# Altium footprint library ref-packages-longpad.PCBLIB: 1527 footprints (part 98 of 103) (continued)
## TSOP28 [mm]
pads (28):
  rect 0.3x1 smd: 1(-3.75,-9.7) 2(-3.25,-9.7) 3(-2.75,-9.7) 4(-2.25,-9.7) 5(-1.75,-9.7) 6(-1.25,-9.7) 7(-0.75,-9.7) 8(0.75,-9.7) 9(1.25,-9.7) 10(1.75,-9.7) 11(2.25,-9.7) 12(2.75,-9.7) 13(3.25,-9.7) 14(3.75,-9.7) 15(3.75,9.7) 16(3.25,9.7) 17(2.75,9.7) 18(2.25,9.7) 19(1.75,9.7) 20(1.25,9.7) 21(0.75,9.7) 22(-0.75,9.7) 23(-1.25,9.7) 24(-1.75,9.7) 25(-2.25,9.7) 26(-2.75,9.7) 27(-3.25,9.7) 28(-3.75,9.7)
Top Overlay:
  lines w0.254: -4,-8.8 -4,8.8 4,8.8 4,-8.8 -4,-8.8
  text "1" at -2.75,-7.4 h1.57
Mechanical 16:
  rectangle: -3.89,-10 -3.61,-8.88
  rectangle: -3.39,-10 -3.11,-8.88
  rectangle: -2.89,-10 -2.61,-8.88
  rectangle: -2.39,-10 -2.11,-8.88
  rectangle: -1.89,-10 -1.61,-8.88
  rectangle: -1.39,-10 -1.11,-8.88
  rectangle: -0.89,-10 -0.61,-8.88
  rectangle: 0.61,-10 0.89,-8.88
  rectangle: 1.11,-10 1.39,-8.88
  rectangle: 1.61,-10 1.89,-8.88
  rectangle: 2.11,-10 2.39,-8.88
  rectangle: 2.61,-10 2.89,-8.88
  rectangle: 3.11,-10 3.39,-8.88
  rectangle: 3.61,-10 3.89,-8.88
  rectangle: 3.61,8.88 3.89,10
  rectangle: 3.11,8.88 3.39,10
  rectangle: 2.61,8.88 2.89,10
  rectangle: 2.11,8.88 2.39,10
  rectangle: 1.61,8.88 1.89,10
  rectangle: 1.11,8.88 1.39,10
  rectangle: 0.61,8.88 0.89,10
  rectangle: -0.89,8.88 -0.61,10
  rectangle: -1.39,8.88 -1.11,10
  rectangle: -1.89,8.88 -1.61,10
  rectangle: -2.39,8.88 -2.11,10
  rectangle: -2.89,8.88 -2.61,10
  rectangle: -3.39,8.88 -3.11,10
  rectangle: -3.89,8.88 -3.61,10

## TSOP32 [mil]
pads (32):
  rect 47.24x14.17 smd: 1(-387.8,147.64) 2(-387.8,127.95) 3(-387.8,108.27) 4(-387.8,88.58) 5(-387.8,68.9) 6(-387.8,49.21) 7(-387.8,29.53) 8(-387.8,9.84) 9(-387.8,-9.84) 10(-387.8,-29.53) 11(-387.8,-49.21) 12(-387.8,-68.9) 13(-387.8,-88.58) 14(-387.8,-108.27) 15(-387.8,-127.95) 16(-387.8,-147.64) 17(387.8,-147.64) 18(387.8,-127.95) 19(387.8,-108.27) 20(387.8,-88.58) 21(387.8,-68.9) 22(387.8,-49.21) 23(387.8,-29.53) 24(387.8,-9.84) 25(387.8,9.84) 26(387.8,29.53) 27(387.8,49.21) 28(387.8,68.9) 29(387.8,88.58) 30(387.8,108.27) 31(387.8,127.95) 32(387.8,147.64)
Top Overlay:
  circle w10: c-323.23,118.11 r15.75
  lines w10: -354.33,-153.54 354.33,-153.54 354.33,153.54 -354.33,153.54 -354.33,-153.54
Mechanical 16:
  rectangle: -398.02,141.64 -356.02,153.64
  rectangle: -398.02,121.95 -356.02,133.95
  rectangle: -398.02,102.27 -356.02,114.27
  rectangle: -398.02,82.58 -356.02,94.58
  rectangle: -398.02,62.9 -356.02,74.9
  rectangle: -398.02,43.21 -356.02,55.21
  rectangle: -398.02,23.53 -356.02,35.53
  rectangle: -398.02,3.84 -356.02,15.84
  rectangle: -398.02,-15.84 -356.02,-3.84
  rectangle: -398.02,-35.53 -356.02,-23.53
  rectangle: -398.02,-55.21 -356.02,-43.21
  rectangle: -398.02,-74.9 -356.02,-62.9
  rectangle: -398.02,-94.58 -356.02,-82.58
  rectangle: -398.02,-114.27 -356.02,-102.27
  rectangle: -398.02,-133.95 -356.02,-121.95
  rectangle: -398.02,-153.64 -356.02,-141.64
  rectangle: 356.02,-153.64 398.02,-141.64
  rectangle: 356.02,-133.95 398.02,-121.95
  rectangle: 356.02,-114.27 398.02,-102.27
  rectangle: 356.02,-94.58 398.02,-82.58
  rectangle: 356.02,-74.9 398.02,-62.9
  rectangle: 356.02,-55.21 398.02,-43.21
  rectangle: 356.02,-35.53 398.02,-23.53
  rectangle: 356.02,-15.84 398.02,-3.84
  rectangle: 356.02,3.84 398.02,15.84
  rectangle: 356.02,23.53 398.02,35.53
  rectangle: 356.02,43.21 398.02,55.21
  rectangle: 356.02,62.9 398.02,74.9
  rectangle: 356.02,82.58 398.02,94.58
  rectangle: 356.02,102.27 398.02,114.27
  rectangle: 356.02,121.95 398.02,133.95
  rectangle: 356.02,141.64 398.02,153.64

## TSOP32L [mil]
pads (32):
  rect 62.99x11.81 smd: 1(-377.95,147.64) 2(-377.95,127.95) 3(-377.95,108.27) 4(-377.95,88.58) 5(-377.95,68.9) 6(-377.95,49.21) 7(-377.95,29.53) 8(-377.95,9.84) 9(-377.95,-9.84) 10(-377.95,-29.53) 11(-377.95,-49.21) 12(-377.95,-68.9) 13(-377.95,-88.58) 14(-377.95,-108.27) 15(-377.95,-127.95) 16(-377.95,-147.64) 17(377.95,-147.64) 18(377.95,-127.95) 19(377.95,-108.27) 20(377.95,-88.58) 21(377.95,-68.9) 22(377.95,-49.21) 23(377.95,-29.53) 24(377.95,-9.84) 25(377.95,9.84) 26(377.95,29.53) 27(377.95,49.21) 28(377.95,68.9) 29(377.95,88.58) 30(377.95,108.27) 31(377.95,127.95) 32(377.95,147.64)
Top Overlay:
  circle w8: c-295.28,108.27 r19.69
Mechanical 16:
  rectangle: -401.57,142.72 -357.28,152.56
  rectangle: -401.57,123.03 -357.28,132.87
  rectangle: -401.57,103.35 -357.28,113.19
  rectangle: -401.57,83.66 -357.28,93.5
  rectangle: -401.57,63.98 -357.28,73.82
  rectangle: -401.57,44.29 -357.28,54.13
  rectangle: -401.57,24.61 -357.28,34.45
  rectangle: -401.57,4.92 -357.28,14.76
  rectangle: -401.57,-14.76 -357.28,-4.92
  rectangle: -401.57,-34.45 -357.28,-24.61
  rectangle: -401.57,-54.13 -357.28,-44.29
  rectangle: -401.57,-73.82 -357.28,-63.98
  rectangle: -401.57,-93.5 -357.28,-83.66
  rectangle: -401.57,-113.19 -357.28,-103.35
  rectangle: -401.57,-132.87 -357.28,-123.03
  rectangle: -401.57,-152.56 -357.28,-142.72
  rectangle: 357.28,-152.56 401.57,-142.72
  rectangle: 357.28,-132.87 401.57,-123.03
  rectangle: 357.28,-113.19 401.57,-103.35
  rectangle: 357.28,-93.5 401.57,-83.66
  rectangle: 357.28,-73.82 401.57,-63.98
  rectangle: 357.28,-54.13 401.57,-44.29
  rectangle: 357.28,-34.45 401.57,-24.61
  rectangle: 357.28,-14.76 401.57,-4.92
  rectangle: 357.28,4.92 401.57,14.76
  rectangle: 357.28,24.61 401.57,34.45
  rectangle: 357.28,44.29 401.57,54.13
  rectangle: 357.28,63.98 401.57,73.82
  rectangle: 357.28,83.66 401.57,93.5
  rectangle: 357.28,103.35 401.57,113.19
  rectangle: 357.28,123.03 401.57,132.87
  rectangle: 357.28,142.72 401.57,152.56
  lines w8: -354.33,-153.54 354.33,-153.54 354.33,153.54 -354.33,153.54 -354.33,-153.54

## TSOP40 [mil]
pads (40):
  rect 11.81x62.99 smd: 1(-187.01,-377.95) 2(-167.32,-377.95) 3(-147.64,-377.95) 4(-127.95,-377.95) 5(-108.27,-377.95) 6(-88.58,-377.95) 7(-68.9,-377.95) 8(-49.21,-377.95) 9(-29.53,-377.95) 10(-9.84,-377.95) 11(9.84,-377.95) 12(29.53,-377.95) 13(49.21,-377.95) 14(68.9,-377.95) 15(88.58,-377.95) 16(108.27,-377.95) 17(127.95,-377.95) 18(147.64,-377.95) 19(167.32,-377.95) 20(187.01,-377.95) 21(187.01,377.95) 22(167.32,377.95) 23(147.64,377.95) 24(127.95,377.95) 25(108.27,377.95) 26(88.58,377.95) 27(68.9,377.95) 28(49.21,377.95) 29(29.53,377.95) 30(9.84,377.95) 31(-9.84,377.95) 32(-29.53,377.95) 33(-49.21,377.95) 34(-68.9,377.95) 35(-88.58,377.95) 36(-108.27,377.95) 37(-127.95,377.95) 38(-147.64,377.95) 39(-167.32,377.95) 40(-187.01,377.95)
Top Overlay:
  circle w10: c-173.23,-311.02 r11.81
  text "40" at -186.27,296.06 h49.6
Mechanical 16:
  rectangle: -192.91,-397.64 -181.1,-364.17
  rectangle: -173.23,-397.64 -161.42,-364.17
  rectangle: -153.54,-397.64 -141.73,-364.17
  rectangle: -133.86,-397.64 -122.05,-364.17
  rectangle: -114.17,-397.64 -102.36,-364.17
  rectangle: -94.49,-397.64 -82.68,-364.17
  rectangle: -74.8,-397.64 -62.99,-364.17
  rectangle: -55.12,-397.64 -43.31,-364.17
  rectangle: -35.43,-397.64 -23.62,-364.17
  rectangle: -15.75,-397.64 -3.94,-364.17
  rectangle: 3.94,-397.64 15.75,-364.17
  rectangle: 23.62,-397.64 35.43,-364.17
  rectangle: 43.31,-397.64 55.12,-364.17
  rectangle: 62.99,-397.64 74.8,-364.17
  rectangle: 82.68,-397.64 94.49,-364.17
  rectangle: 102.36,-397.64 114.17,-364.17
  rectangle: 122.05,-397.64 133.86,-364.17
  rectangle: 141.73,-397.64 153.54,-364.17
  rectangle: 161.42,-397.64 173.23,-364.17
  rectangle: 181.1,-397.64 192.91,-364.17
  rectangle: 181.1,364.17 192.91,397.64
  rectangle: 161.42,364.17 173.23,397.64
  rectangle: 141.73,364.17 153.54,397.64
  rectangle: 122.05,364.17 133.86,397.64
  rectangle: 102.36,364.17 114.17,397.64
  rectangle: 82.68,364.17 94.49,397.64
  rectangle: 62.99,364.17 74.8,397.64
  rectangle: 43.31,364.17 55.12,397.64
  rectangle: 23.62,364.17 35.43,397.64
  rectangle: 3.94,364.17 15.75,397.64
  rectangle: -15.75,364.17 -3.94,397.64
  rectangle: -35.43,364.17 -23.62,397.64
  rectangle: -55.12,364.17 -43.31,397.64
  rectangle: -74.8,364.17 -62.99,397.64
  rectangle: -94.49,364.17 -82.68,397.64
  rectangle: -114.17,364.17 -102.36,397.64
  rectangle: -133.86,364.17 -122.05,397.64
  rectangle: -153.54,364.17 -141.73,397.64
  rectangle: -173.23,364.17 -161.42,397.64
  rectangle: -192.91,364.17 -181.1,397.64
  lines w8: -196.65,-362.01 196.65,-362.01 196.65,362.01 -196.65,362.01 -196.65,-362.01

## TSOP40L [mil]
pads (40):
  rect 62.99x11.81 smd: 1(-377.95,187.01) 2(-377.95,167.32) 3(-377.95,147.64) 4(-377.95,127.95) 5(-377.95,108.27) 6(-377.95,88.58) 7(-377.95,68.9) 8(-377.95,49.21) 9(-377.95,29.53) 10(-377.95,9.84) 11(-377.95,-9.84) 12(-377.95,-29.53) 13(-377.95,-49.21) 14(-377.95,-68.9) 15(-377.95,-88.58) 16(-377.95,-108.27) 17(-377.95,-127.95) 18(-377.95,-147.64) 19(-377.95,-167.32) 20(-377.95,-187.01) 21(377.95,-187.01) 22(377.95,-167.32) 23(377.95,-147.64) 24(377.95,-127.95) 25(377.95,-108.27) 26(377.95,-88.58) 27(377.95,-68.9) 28(377.95,-49.21) 29(377.95,-29.53) 30(377.95,-9.84) 31(377.95,9.84) 32(377.95,29.53) 33(377.95,49.21) 34(377.95,68.9) 35(377.95,88.58) 36(377.95,108.27) 37(377.95,127.95) 38(377.95,147.64) 39(377.95,167.32) 40(377.95,187.01)
Top Overlay:
  circle w8: c-305.12,147.64 r19.69
Mechanical 16:
  rectangle: -401.57,182.09 -357.28,191.93
  rectangle: -401.57,162.4 -357.28,172.24
  rectangle: -401.57,142.72 -357.28,152.56
  rectangle: -401.57,123.03 -357.28,132.87
  rectangle: -401.57,103.35 -357.28,113.19
  rectangle: -401.57,83.66 -357.28,93.5
  rectangle: -401.57,63.98 -357.28,73.82
  rectangle: -401.57,44.29 -357.28,54.13
  rectangle: -401.57,24.61 -357.28,34.45
  rectangle: -401.57,4.92 -357.28,14.76
  rectangle: -401.57,-14.76 -357.28,-4.92
  rectangle: -401.57,-34.45 -357.28,-24.61
  rectangle: -401.57,-54.13 -357.28,-44.29
  rectangle: -401.57,-73.82 -357.28,-63.98
  rectangle: -401.57,-93.5 -357.28,-83.66
  rectangle: -401.57,-113.19 -357.28,-103.35
  rectangle: -401.57,-132.87 -357.28,-123.03
  rectangle: -401.57,-152.56 -357.28,-142.72
  rectangle: -401.57,-172.24 -357.28,-162.4
  rectangle: -401.57,-191.93 -357.28,-182.09
  rectangle: 357.28,-191.93 401.57,-182.09
  rectangle: 357.28,-172.24 401.57,-162.4
  rectangle: 357.28,-152.56 401.57,-142.72
  rectangle: 357.28,-132.87 401.57,-123.03
  rectangle: 357.28,-113.19 401.57,-103.35
  rectangle: 357.28,-93.5 401.57,-83.66
  rectangle: 357.28,-73.82 401.57,-63.98
  rectangle: 357.28,-54.13 401.57,-44.29
  rectangle: 357.28,-34.45 401.57,-24.61
  rectangle: 357.28,-14.76 401.57,-4.92
  rectangle: 357.28,4.92 401.57,14.76
  rectangle: 357.28,24.61 401.57,34.45
  rectangle: 357.28,44.29 401.57,54.13
  rectangle: 357.28,63.98 401.57,73.82
  rectangle: 357.28,83.66 401.57,93.5
  rectangle: 357.28,103.35 401.57,113.19
  rectangle: 357.28,123.03 401.57,132.87
  rectangle: 357.28,142.72 401.57,152.56
  rectangle: 357.28,162.4 401.57,172.24
  rectangle: 357.28,182.09 401.57,191.93
  lines w8: -354.33,-192.91 354.33,-192.91 354.33,192.91 -354.33,192.91 -354.33,-192.91

## TSOP48 [mil]
pads (48):
  rect 11.81x62.99 smd: 1(-226.38,-377.95) 2(-206.69,-377.95) 3(-187.01,-377.95) 4(-167.32,-377.95) 5(-147.64,-377.95) 6(-127.95,-377.95) 7(-108.27,-377.95) 8(-88.58,-377.95) 9(-68.9,-377.95) 10(-49.21,-377.95) 11(-29.53,-377.95) 12(-9.84,-377.95) 13(9.84,-377.95) 14(29.53,-377.95) 15(49.21,-377.95) 16(68.9,-377.95) 17(88.58,-377.95) 18(108.27,-377.95) 19(127.95,-377.95) 20(147.64,-377.95) 21(167.32,-377.95) 22(187.01,-377.95) 23(206.69,-377.95) 24(226.38,-377.95) 25(226.38,377.95) 26(206.69,377.95) 27(187.01,377.95) 28(167.32,377.95) 29(147.64,377.95) 30(127.95,377.95) 31(108.27,377.95) 32(88.58,377.95) 33(68.9,377.95) 34(49.21,377.95) 35(29.53,377.95) 36(9.84,377.95) 37(-9.84,377.95) 38(-29.53,377.95) 39(-49.21,377.95) 40(-68.9,377.95) 41(-88.58,377.95) 42(-108.27,377.95) 43(-127.95,377.95) 44(-147.64,377.95) 45(-167.32,377.95) 46(-187.01,377.95) 47(-206.69,377.95) 48(-226.38,377.95)
Top Overlay:
  circle w10: c-196.85,-314.96 r19.69
  text "1" at -225.64,-274.8 h49.6
  text "48" at -225.64,296.06 h49.6
Mechanical 16:
  rectangle: -232.28,-397.64 -220.47,-364.17
  rectangle: -212.6,-397.64 -200.79,-364.17
  rectangle: -192.91,-397.64 -181.1,-364.17
  rectangle: -173.23,-397.64 -161.42,-364.17
  rectangle: -153.54,-397.64 -141.73,-364.17
  rectangle: -133.86,-397.64 -122.05,-364.17
  rectangle: -114.17,-397.64 -102.36,-364.17
  rectangle: -94.49,-397.64 -82.68,-364.17
  rectangle: -74.8,-397.64 -62.99,-364.17
  rectangle: -55.12,-397.64 -43.31,-364.17
  rectangle: -35.43,-397.64 -23.62,-364.17
  rectangle: -15.75,-397.64 -3.94,-364.17
  rectangle: 3.94,-397.64 15.75,-364.17
  rectangle: 23.62,-397.64 35.43,-364.17
  rectangle: 43.31,-397.64 55.12,-364.17
  rectangle: 62.99,-397.64 74.8,-364.17
  rectangle: 82.68,-397.64 94.49,-364.17
  rectangle: 102.36,-397.64 114.17,-364.17
  rectangle: 122.05,-397.64 133.86,-364.17
  rectangle: 141.73,-397.64 153.54,-364.17
  rectangle: 161.42,-397.64 173.23,-364.17
  rectangle: 181.1,-397.64 192.91,-364.17
  rectangle: 200.79,-397.64 212.6,-364.17
  rectangle: 220.47,-397.64 232.28,-364.17
  rectangle: 220.47,364.17 232.28,397.64
  rectangle: 200.79,364.17 212.6,397.64
  rectangle: 181.1,364.17 192.91,397.64
  rectangle: 161.42,364.17 173.23,397.64
  rectangle: 141.73,364.17 153.54,397.64
  rectangle: 122.05,364.17 133.86,397.64
  rectangle: 102.36,364.17 114.17,397.64
  rectangle: 82.68,364.17 94.49,397.64
  rectangle: 62.99,364.17 74.8,397.64
  rectangle: 43.31,364.17 55.12,397.64
  rectangle: 23.62,364.17 35.43,397.64
  rectangle: 3.94,364.17 15.75,397.64
  rectangle: -15.75,364.17 -3.94,397.64
  rectangle: -35.43,364.17 -23.62,397.64
  rectangle: -55.12,364.17 -43.31,397.64
  rectangle: -74.8,364.17 -62.99,397.64
  rectangle: -94.49,364.17 -82.68,397.64
  rectangle: -114.17,364.17 -102.36,397.64
  rectangle: -133.86,364.17 -122.05,397.64
  rectangle: -153.54,364.17 -141.73,397.64
  rectangle: -173.23,364.17 -161.42,397.64
  rectangle: -192.91,364.17 -181.1,397.64
  rectangle: -212.6,364.17 -200.79,397.64
  rectangle: -232.28,364.17 -220.47,397.64
  rectangle: -30,16.11 -16,38.11
  rectangle: 16,16.11 30,38.11
  rectangle: 5,-126.89 15,-96.89
  rectangle: -30,13.11 30,28.11
  region: 0,0 10,0 10,10 0,10
  region: 0,0 10,0 10,10 0,10
  region: 0,0 10,0 10,10 0,10
  region: 0,0 10,0 10,10 0,10
  lines w2: -29,37.11 cw(c0,37.11) 29,37.11
  lines w8: -25,37.11 cw(c0,37.11) 25,37.11 ; -236.02,-362.01 236.02,-362.01 236.02,362.01 -236.02,362.01 -236.02,-362.01
  lines w10: -21,37.11 cw(c0,37.11) 21,37.11

## TSOP48L [mil]
pads (48):
  rect 62.99x11.81 smd: 1(-377.95,226.38) 2(-377.95,206.69) 3(-377.95,187.01) 4(-377.95,167.32) 5(-377.95,147.64) 6(-377.95,127.95) 7(-377.95,108.27) 8(-377.95,88.58) 9(-377.95,68.9) 10(-377.95,49.21) 11(-377.95,29.53) 12(-377.95,9.84) 13(-377.95,-9.84) 14(-377.95,-29.53) 15(-377.95,-49.21) 16(-377.95,-68.9) 17(-377.95,-88.58) 18(-377.95,-108.27) 19(-377.95,-127.95) 20(-377.95,-147.64) 21(-377.95,-167.32) 22(-377.95,-187.01) 23(-377.95,-206.69) 24(-377.95,-226.38) 25(377.95,-226.38) 26(377.95,-206.69) 27(377.95,-187.01) 28(377.95,-167.32) 29(377.95,-147.64) 30(377.95,-127.95) 31(377.95,-108.27) 32(377.95,-88.58) 33(377.95,-68.9) 34(377.95,-49.21) 35(377.95,-29.53) 36(377.95,-9.84) 37(377.95,9.84) 38(377.95,29.53) 39(377.95,49.21) 40(377.95,68.9) 41(377.95,88.58) 42(377.95,108.27) 43(377.95,127.95) 44(377.95,147.64) 45(377.95,167.32) 46(377.95,187.01) 47(377.95,206.69) 48(377.95,226.38)
Top Overlay:
  circle w8: c-305.12,187.01 r19.69
Mechanical 16:
  rectangle: -401.57,221.46 -357.28,231.3
  rectangle: -401.57,201.77 -357.28,211.61
  rectangle: -401.57,182.09 -357.28,191.93
  rectangle: -401.57,162.4 -357.28,172.24
  rectangle: -401.57,142.72 -357.28,152.56
  rectangle: -401.57,123.03 -357.28,132.87
  rectangle: -401.57,103.35 -357.28,113.19
  rectangle: -401.57,83.66 -357.28,93.5
  rectangle: -401.57,63.98 -357.28,73.82
  rectangle: -401.57,44.29 -357.28,54.13
  rectangle: -401.57,24.61 -357.28,34.45
  rectangle: -401.57,4.92 -357.28,14.76
  rectangle: -401.57,-14.76 -357.28,-4.92
  rectangle: -401.57,-34.45 -357.28,-24.61
  rectangle: -401.57,-54.13 -357.28,-44.29
  rectangle: -401.57,-73.82 -357.28,-63.98
  rectangle: -401.57,-93.5 -357.28,-83.66
  rectangle: -401.57,-113.19 -357.28,-103.35
  rectangle: -401.57,-132.87 -357.28,-123.03
  rectangle: -401.57,-152.56 -357.28,-142.72
  rectangle: -401.57,-172.24 -357.28,-162.4
  rectangle: -401.57,-191.93 -357.28,-182.09
  rectangle: -401.57,-211.61 -357.28,-201.77
  rectangle: -401.57,-231.3 -357.28,-221.46
  rectangle: 357.28,-231.3 401.57,-221.46
  rectangle: 357.28,-211.61 401.57,-201.77
  rectangle: 357.28,-191.93 401.57,-182.09
  rectangle: 357.28,-172.24 401.57,-162.4
  rectangle: 357.28,-152.56 401.57,-142.72
  rectangle: 357.28,-132.87 401.57,-123.03
  rectangle: 357.28,-113.19 401.57,-103.35
  rectangle: 357.28,-93.5 401.57,-83.66
  rectangle: 357.28,-73.82 401.57,-63.98
  rectangle: 357.28,-54.13 401.57,-44.29
  rectangle: 357.28,-34.45 401.57,-24.61
  rectangle: 357.28,-14.76 401.57,-4.92
  rectangle: 357.28,4.92 401.57,14.76
  rectangle: 357.28,24.61 401.57,34.45
  rectangle: 357.28,44.29 401.57,54.13
  rectangle: 357.28,63.98 401.57,73.82
  rectangle: 357.28,83.66 401.57,93.5
  rectangle: 357.28,103.35 401.57,113.19
  rectangle: 357.28,123.03 401.57,132.87
  rectangle: 357.28,142.72 401.57,152.56
  rectangle: 357.28,162.4 401.57,172.24
  rectangle: 357.28,182.09 401.57,191.93
  rectangle: 357.28,201.77 401.57,211.61
  rectangle: 357.28,221.46 401.57,231.3
  lines w8: -354.33,-232.28 354.33,-232.28 354.33,232.28 -354.33,232.28 -354.33,-232.28

## TSOP56 [mm]
pads (56):
  rect 1.2x0.25 smd: 1(-9.7,6.75) 2(-9.7,6.25) 3(-9.7,5.75) 4(-9.7,5.25) 5(-9.7,4.75) 6(-9.7,4.25) 7(-9.7,3.75) 8(-9.7,3.25) 9(-9.7,2.75) 10(-9.7,2.25) 11(-9.7,1.75) 12(-9.7,1.25) 13(-9.7,0.75) 14(-9.7,0.25) 15(-9.7,-0.25) 16(-9.7,-0.75) 17(-9.7,-1.25) 18(-9.7,-1.75) 19(-9.7,-2.25) 20(-9.7,-2.75) 21(-9.7,-3.25) 22(-9.7,-3.75) 23(-9.7,-4.25) 24(-9.7,-4.75) 25(-9.7,-5.25) 26(-9.7,-5.75) 27(-9.7,-6.25) 28(-9.7,-6.75) 29(9.7,-6.75) 30(9.7,-6.25) 31(9.7,-5.75) 32(9.7,-5.25) 33(9.7,-4.75) 34(9.7,-4.25) 35(9.7,-3.75) 36(9.7,-3.25) 37(9.7,-2.75) 38(9.7,-2.25) 39(9.7,-1.75) 40(9.7,-1.25) 41(9.7,-0.75) 42(9.7,-0.25) 43(9.7,0.25) 44(9.7,0.75) 45(9.7,1.25) 46(9.7,1.75) 47(9.7,2.25) 48(9.7,2.75) 49(9.7,3.25) 50(9.7,3.75) 51(9.7,4.25) 52(9.7,4.75) 53(9.7,5.25) 54(9.7,5.75) 55(9.7,6.25) 56(9.7,6.75)
Top Overlay:
  circle w0.203: c-7.5,5.5 r1
  circle w0.203: c-8,-6 r0.5
  circle w0.203: c8,-6 r0.5
  circle w0.203: c8,5.5 r0.5
  lines w0.203: -9.1,-6.9 9.1,-6.9 ; -9.1,6.9 9.1,6.9
Mechanical 16:
  rectangle: -10,6.675 -9.175,6.825
  rectangle: -10,6.175 -9.175,6.325
  rectangle: -10,5.675 -9.175,5.825
  rectangle: -10,5.175 -9.175,5.325
  rectangle: -10,4.675 -9.175,4.825
  rectangle: -10,4.175 -9.175,4.325
  rectangle: -10,3.675 -9.175,3.825
  rectangle: -10,3.175 -9.175,3.325
  rectangle: -10,2.675 -9.175,2.825
  rectangle: -10,2.175 -9.175,2.325
  rectangle: -10,1.675 -9.175,1.825
  rectangle: -10,1.175 -9.175,1.325
  rectangle: -10,0.675 -9.175,0.825
  rectangle: -10,0.175 -9.175,0.325
  rectangle: -10,-0.325 -9.175,-0.175
  rectangle: -10,-0.825 -9.175,-0.675
  rectangle: -10,-1.325 -9.175,-1.175
  rectangle: -10,-1.825 -9.175,-1.675
  rectangle: -10,-2.325 -9.175,-2.175
  rectangle: -10,-2.825 -9.175,-2.675
  rectangle: -10,-3.325 -9.175,-3.175
  rectangle: -10,-3.825 -9.175,-3.675
  rectangle: -10,-4.325 -9.175,-4.175
  rectangle: -10,-4.825 -9.175,-4.675
  rectangle: -10,-5.325 -9.175,-5.175
  rectangle: -10,-5.825 -9.175,-5.675
  rectangle: -10,-6.325 -9.175,-6.175
  rectangle: -10,-6.825 -9.175,-6.675
  rectangle: 9.175,-6.825 10,-6.675
  rectangle: 9.175,-6.325 10,-6.175
  rectangle: 9.175,-5.825 10,-5.675
  rectangle: 9.175,-5.325 10,-5.175
  rectangle: 9.175,-4.825 10,-4.675
  rectangle: 9.175,-4.325 10,-4.175
  rectangle: 9.175,-3.825 10,-3.675
  rectangle: 9.175,-3.325 10,-3.175
  rectangle: 9.175,-2.825 10,-2.675
  rectangle: 9.175,-2.325 10,-2.175
  rectangle: 9.175,-1.825 10,-1.675
  rectangle: 9.175,-1.325 10,-1.175
  rectangle: 9.175,-0.825 10,-0.675
  rectangle: 9.175,-0.325 10,-0.175
  rectangle: 9.175,0.175 10,0.325
  rectangle: 9.175,0.675 10,0.825
  rectangle: 9.175,1.175 10,1.325
  rectangle: 9.175,1.675 10,1.825
  rectangle: 9.175,2.175 10,2.325
  rectangle: 9.175,2.675 10,2.825
  rectangle: 9.175,3.175 10,3.325
  rectangle: 9.175,3.675 10,3.825
  rectangle: 9.175,4.175 10,4.325
  rectangle: 9.175,4.675 10,4.825
  rectangle: 9.175,5.175 10,5.325
  rectangle: 9.175,5.675 10,5.825
  rectangle: 9.175,6.175 10,6.325
  rectangle: 9.175,6.675 10,6.825
  lines w0.203: -9.1,-6.9 -9.1,6.9 ; 9.1,-6.9 9.1,6.9

## TSOP56L [mil]
pads (56):
  rect 62.99x11.81 smd: 1(-377.95,265.75) 2(-377.95,246.06) 3(-377.95,226.38) 4(-377.95,206.69) 5(-377.95,187.01) 6(-377.95,167.32) 7(-377.95,147.64) 8(-377.95,127.95) 9(-377.95,108.27) 10(-377.95,88.58) 11(-377.95,68.9) 12(-377.95,49.21) 13(-377.95,29.53) 14(-377.95,9.84) 15(-377.95,-9.84) 16(-377.95,-29.53) 17(-377.95,-49.21) 18(-377.95,-68.9) 19(-377.95,-88.58) 20(-377.95,-108.27) 21(-377.95,-127.95) 22(-377.95,-147.64) 23(-377.95,-167.32) 24(-377.95,-187.01) 25(-377.95,-206.69) 26(-377.95,-226.38) 27(-377.95,-246.06) 28(-377.95,-265.75) 29(377.95,-265.75) 30(377.95,-246.06) 31(377.95,-226.38) 32(377.95,-206.69) 33(377.95,-187.01) 34(377.95,-167.32) 35(377.95,-147.64) 36(377.95,-127.95) 37(377.95,-108.27) 38(377.95,-88.58) 39(377.95,-68.9) 40(377.95,-49.21) 41(377.95,-29.53) 42(377.95,-9.84) 43(377.95,9.84) 44(377.95,29.53) 45(377.95,49.21) 46(377.95,68.9) 47(377.95,88.58) 48(377.95,108.27) 49(377.95,127.95) 50(377.95,147.64) 51(377.95,167.32) 52(377.95,187.01) 53(377.95,206.69) 54(377.95,226.38) 55(377.95,246.06) 56(377.95,265.75)
Top Overlay:
  circle w8: c-314.96,236.22 r19.69
Mechanical 16:
  rectangle: -401.57,260.83 -357.28,270.67
  rectangle: -401.57,241.14 -357.28,250.98
  rectangle: -401.57,221.46 -357.28,231.3
  rectangle: -401.57,201.77 -357.28,211.61
  rectangle: -401.57,182.09 -357.28,191.93
  rectangle: -401.57,162.4 -357.28,172.24
  rectangle: -401.57,142.72 -357.28,152.56
  rectangle: -401.57,123.03 -357.28,132.87
  rectangle: -401.57,103.35 -357.28,113.19
  rectangle: -401.57,83.66 -357.28,93.5
  rectangle: -401.57,63.98 -357.28,73.82
  rectangle: -401.57,44.29 -357.28,54.13
  rectangle: -401.57,24.61 -357.28,34.45
  rectangle: -401.57,4.92 -357.28,14.76
  rectangle: -401.57,-14.76 -357.28,-4.92
  rectangle: -401.57,-34.45 -357.28,-24.61
  rectangle: -401.57,-54.13 -357.28,-44.29
  rectangle: -401.57,-73.82 -357.28,-63.98
  rectangle: -401.57,-93.5 -357.28,-83.66
  rectangle: -401.57,-113.19 -357.28,-103.35
  rectangle: -401.57,-132.87 -357.28,-123.03
  rectangle: -401.57,-152.56 -357.28,-142.72
  rectangle: -401.57,-172.24 -357.28,-162.4
  rectangle: -401.57,-191.93 -357.28,-182.09
  rectangle: -401.57,-211.61 -357.28,-201.77
  rectangle: -401.57,-231.3 -357.28,-221.46
  rectangle: -401.57,-250.98 -357.28,-241.14
  rectangle: -401.57,-270.67 -357.28,-260.83
  rectangle: 357.28,-270.67 401.57,-260.83
  rectangle: 357.28,-250.98 401.57,-241.14
  rectangle: 357.28,-231.3 401.57,-221.46
  rectangle: 357.28,-211.61 401.57,-201.77
  rectangle: 357.28,-191.93 401.57,-182.09
  rectangle: 357.28,-172.24 401.57,-162.4
  rectangle: 357.28,-152.56 401.57,-142.72
  rectangle: 357.28,-132.87 401.57,-123.03
  rectangle: 357.28,-113.19 401.57,-103.35
  rectangle: 357.28,-93.5 401.57,-83.66
  rectangle: 357.28,-73.82 401.57,-63.98
  rectangle: 357.28,-54.13 401.57,-44.29
  rectangle: 357.28,-34.45 401.57,-24.61
  rectangle: 357.28,-14.76 401.57,-4.92
  rectangle: 357.28,4.92 401.57,14.76
  rectangle: 357.28,24.61 401.57,34.45
  rectangle: 357.28,44.29 401.57,54.13
  rectangle: 357.28,63.98 401.57,73.82
  rectangle: 357.28,83.66 401.57,93.5
  rectangle: 357.28,103.35 401.57,113.19
  rectangle: 357.28,123.03 401.57,132.87
  rectangle: 357.28,142.72 401.57,152.56
  rectangle: 357.28,162.4 401.57,172.24
  rectangle: 357.28,182.09 401.57,191.93
  rectangle: 357.28,201.77 401.57,211.61
  rectangle: 357.28,221.46 401.57,231.3
  rectangle: 357.28,241.14 401.57,250.98
  rectangle: 357.28,260.83 401.57,270.67
  lines w8: -354.33,-271.65 354.33,-271.65 354.33,271.65 -354.33,271.65 -354.33,-271.65

## TSSOP8 [mm]
pads (8):
  rect 1.2x0.35 smd: 1(-2.925,0.975) 2(-2.925,0.325) 3(-2.925,-0.325) 4(-2.925,-0.975) 5(2.925,-0.975) 6(2.925,-0.325) 7(2.925,0.325) 8(2.925,0.975)
Top Overlay:
  circle w0: c-1.625,0.65 r0.325
  lines w0.203: -2.15,-1.4 2.15,-1.4 2.15,1.4 -2.15,1.4 -2.15,-1.4
Mechanical 16:
  rectangle: -3.2,0.85 -2.2,1.1
  rectangle: -3.2,0.2 -2.2,0.45
  rectangle: -3.2,-0.45 -2.2,-0.2
  rectangle: -3.2,-1.1 -2.2,-0.85
  rectangle: 2.2,-1.1 3.2,-0.85
  rectangle: 2.2,-0.45 3.2,-0.2
  rectangle: 2.2,0.2 3.2,0.45
  rectangle: 2.2,0.85 3.2,1.1